# Altium footprint library power_board_pcbblib.PcbLib: 57 footprints (part 2 of 4)
Each footprint in its own frame and in the unit in brackets; x right, y up, seen from the top. Pads: shape width x height; smd on the part's side, far side on the other; paste and mask are expansions set on the pad; w line width, h text height; cw(c..) or ccw(c..) is an arc to the next point about the centre after c.
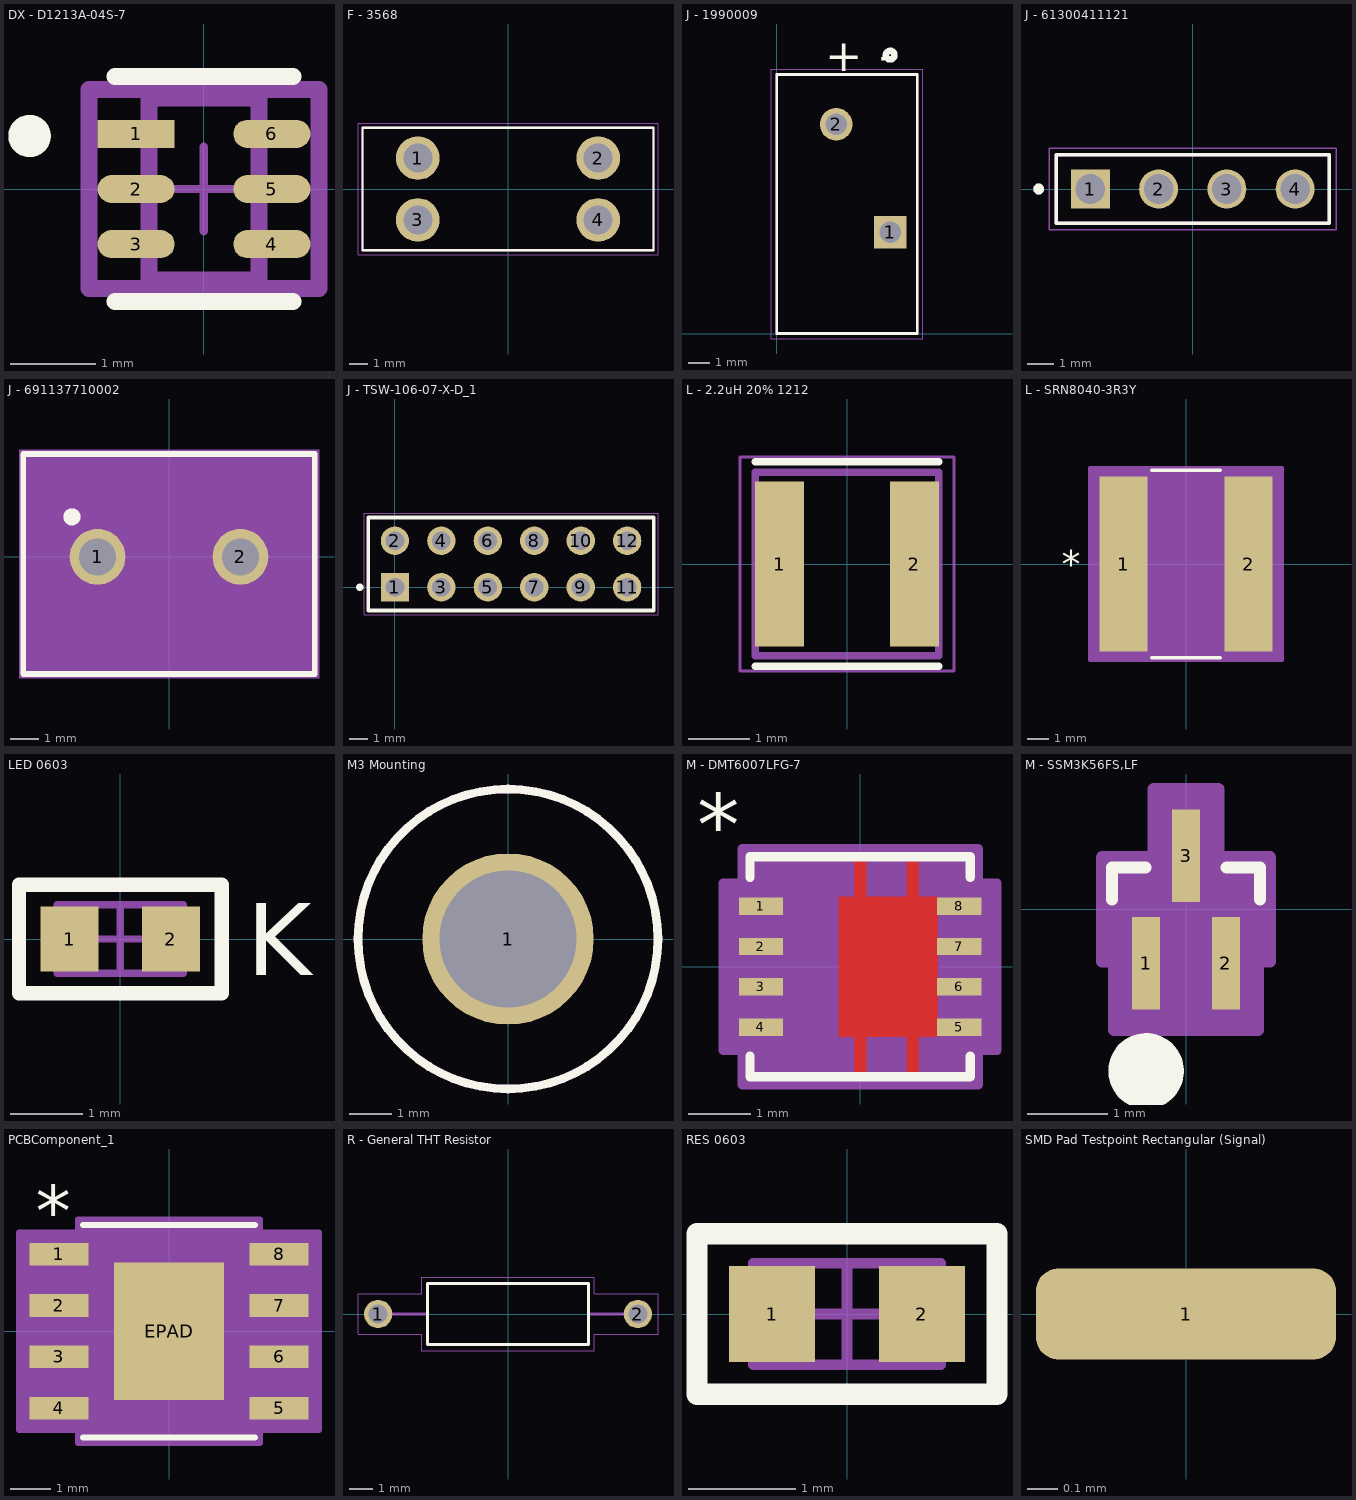
[diagram p1: the footprints below, top view; thin cyan lines are the x and y axes]

## DX - D1213A-04S-7 [mm]
pads (6):
  rect 0.91x0.332 smd paste+0 mask+0: 1(-0.801,0.65)
  rrect100% 0.91x0.332 smd paste+0 mask+0: 2(-0.801,0) 3(-0.801,-0.65) 4(0.801,-0.65) 5(0.801,0) 6(0.801,0.65)
Top Overlay:
  circle w0.25: c-2.056,0.625 r0.125
  lines w0.2: -1.05,-1.325 1.05,-1.325 ; -1.05,1.325 1.05,1.325
Top 3D Body:
  lines w0.2: -0.65,-1.075 -0.65,1.075 0.65,1.075 0.65,-1.075 -0.65,-1.075
Board:
  lines w0.2: -1.356,-1.175 -1.356,1.175 1.356,1.175 1.356,-1.175 -1.356,-1.175
Top Assembly:
  lines w0.2: -1.356,-1.175 -1.356,1.175 1.356,1.175 1.356,-1.175 -1.356,-1.175
  text ".Designator" at 0,0.188 h1
Top Component Center:
  lines w0.1: -0.5,0 0.5,0 ; 0,-0.5 0,0.5
3D body "Trans_Diodes_BSS8402DW-7-F_eec.STEP": height 0.25, standoff 0, extent -1.356,-1.175 1.356,1.175

## F - 3568 [mm] "3568 - Fuse Holder 30 A 500V 1 Circuit Blade Through Hole"
pads (4):
  round 2.4 hole 1.6: 1(-4.96,1.7) 2(4.96,1.7) 3(-4.96,-1.7) 4(4.96,-1.7)
Top Overlay:
  lines w0.127: -8,-3.365 -8,3.365 8,3.365 8,-3.365 -8,-3.365
Mechanical 13:
  lines w0.127: -8,-3.365 -8,3.365 8,3.365 8,-3.365 -8,-3.365
Mechanical 15:
  lines w0.05: -8.25,-3.615 -8.25,3.615 8.25,3.615 8.25,-3.615 -8.25,-3.615
3D body "step_temp.STEP": height 7.38, standoff -2.78, extent -8,-3.366 8.002,3.365

## J - 1990009 [mm]
pads (2):
  rect 1.508x1.508 / inner round 1.508 / far side rect 1.508x1.508 hole 1: 1(5.25,4.7)
  round 1.508 hole 1: 2(2.75,9.7)
Top Overlay:
  circle w0.3: c5.25,12.9 r0.2
  lines w0.127: 0,0 6.5,0 6.5,12 0,12 0,0
  text "+" at 2.25,12.15 h1.5
  text "-" at 4.75,12.15 h1.5
Mechanical 13:
  lines w0.127: 0,0 6.5,0 6.5,12 0,12 0,0
Mechanical 15:
  lines w0.05: -0.25,-0.25 6.75,-0.25 6.75,12.25 -0.25,12.25 -0.25,-0.25
3D body "1990009--3DModel-STEP-269445.STEP": height 13.11, standoff -3.49, extent -0.05,-0.014 6.45,11.986

## J - 61300411121 [mm]
pads (4):
  rect 1.45x1.45 / inner round 1.45 / far side rect 1.45x1.45 hole 1.1: 1(-3.81,0)
  round 1.45 hole 1.1: 2(-1.27,0) 3(1.27,0) 4(3.81,0)
Top Overlay:
  circle w0.2: c-5.73,0 r0.1
  lines w0.127: -5.08,-1.27 5.08,-1.27 5.08,1.27 -5.08,1.27 -5.08,-1.27
Mechanical 13:
  circle w0.2: c-5.73,0 r0.1
  lines w0.127: -5.08,-1.27 5.08,-1.27 5.08,1.27 -5.08,1.27 -5.08,-1.27
Mechanical 15:
  lines w0.05: -5.33,-1.52 5.33,-1.52 5.33,1.52 -5.33,1.52 -5.33,-1.52
3D body "step_temp.STEP": height 7.27, standoff -4.27, extent -5.08,-1.27 5.08,1.27

## J - 691137710002 [mm]
pads (2):
  round 1.95 hole 1.3: 1(-2.5,0) 2(2.5,0)
Top Overlay:
  circle w0.4: c-3.4,1.4 r0.1
  lines w0.2: -5.1,-4.1 5.1,-4.1 5.1,3.6 -5.1,3.6 -5.1,-4.1
Mechanical 13:
  lines w0.1: -5,-4 5,-4 5,3.5 -5,3.5 -5,-4
Mechanical 15:
  region: 5.25,-4.25 -5.25,-4.25 -5.25,3.75 5.25,3.75
3D body "step_temp.STEP": height 11.5, standoff -3.6, extent -5,-3.9 5,3.6

## J - TSW-106-07-X-D_1 [mm]
pads (12):
  rect 1.55x1.55 hole 1.02: 1(0,0)
  round 1.55 hole 1.02: 2(0,2.54) 3(2.54,0) 4(2.54,2.54) 5(5.08,0) 6(5.08,2.54) 7(7.62,0) 8(7.62,2.54) 9(10.16,0) 10(10.16,2.54) 11(12.7,0) 12(12.7,2.54)
Top Overlay:
  circle w0.2: c-1.92,0 r0.1
  lines w0.2: -1.46,-1.27 -1.46,3.81 14.16,3.81 14.16,-1.27 -1.46,-1.27
Mechanical 13:
  lines w0.1: -1.46,-1.27 -1.46,3.81 14.16,3.81 14.16,-1.27 -1.46,-1.27
Mechanical 15:
  lines w0.05: -1.685,-1.495 -1.685,4.035 14.385,4.035 14.385,-1.495 -1.685,-1.495
3D body "TSW-106-07-X-D.step": height 8.38, standoff -2.54, extent -1.27,-1.27 13.97,3.81

## L - 2.2uH 20% 1212 [mm]
pads (2):
  rect 0.8x2.7 smd: 1(-1.1,0) 2(1.1,0)
Top Overlay:
  lines w0.127: -1.5,-1.67 1.5,-1.67 ; -1.5,1.67 1.5,1.67
Mechanical 13:
  lines w0.127: -1.5,-1.5 1.5,-1.5 1.5,1.5 -1.5,1.5 -1.5,-1.5
Mechanical 15:
  lines w0.05: -1.75,-1.75 1.75,-1.75 1.75,1.75 -1.75,1.75 -1.75,-1.75
3D body "LQH3NPZ2R2MMEL.STEP": height 1.51, standoff 0.01, extent -1.5,-1.5 1.5,1.5

## L - SRN8040-3R3Y [mil] "SRN8040-3R3Y"
pads (2):
  rect 87x315 smd paste+0 mask+0: 1(-112.5,0) 2(112.5,0)
Top Overlay:
  lines w6: -61.89,-168.5 61.89,-168.5 ; -61.89,168.5 61.89,168.5
  text "*" at -223.35,-24.99 h50
Mechanical 13:
  lines w1: -163.5,-81.75 -163.5,81.75 -81.75,163.5 81.75,163.5 163.5,81.75 163.5,-81.75 81.75,-163.5 -81.75,-163.5 -163.5,-81.75
  text "*" at -156,-50 h50
Mechanical 15:
  region: 173.5,-173.5 -173.5,-173.5 -173.5,173.5 173.5,173.5
  lines w6: -173.5,-173.5 -173.5,173.5 173.5,173.5 173.5,-173.5 -173.5,-173.5
3D body "7435157.stp": height 157.98, standoff 0.5, extent -157.48,-157.48 157.48,157.48

## LED 0603 [mm]
pads (2):
  rect 0.8x0.9 smd: 1(-0.7,0) 2(0.7,0)
Top Overlay:
  lines w0.2: -1.4,-0.75 -1.4,0.75 1.4,0.75 1.4,-0.75 -1.4,-0.75
  text "K" at 1.748,-0.5 h1
Mechanical 13:
  lines w0.1: -0.875,-0.475 -0.875,0.475 0.875,0.475 0.875,-0.475 -0.875,-0.475
Mechanical 15:
  lines w0.1: -0.475,0 0.475,0 ; 0,-0.475 0,0.475 ; -1.4,-0.75 1.4,-0.75 1.4,0.75 -1.4,0.75 -1.4,-0.75
3D body "Diode_Osram_Opto_LS_L29K-G1J2-1-Z_eec.STEP": height 0.25, standoff 0, extent -1.25,-0.55 1.25,0.55

## M3 Mounting [mm]
pads (1):
  round 4 hole 3.2: 1(0,0)
Top Layer keep-out:
  circle w0.2: c0,0 r3.5
Top Overlay:
  circle w0.2: c0,0 r3.5

## M - DMT6007LFG-7 [mil]
height 267.72
pads (8):
  rect 28x11 smd paste+0 mask+0: 1(-63,38.39) 2(-63,12.8) 3(-63,-12.8) 4(-63,-38.39) 5(63,-38.39) 6(63,-12.8) 7(63,12.8) 8(63,38.39)
Top Layer:
  rectangle: -3.94,-66.93 3.94,-43.31
  rectangle: 29.53,-66.93 37.4,-43.31
  rectangle: -3.94,43.31 3.94,66.93
  rectangle: 29.53,43.31 37.4,66.93
  region: -13.7,44.5 49.3,44.5 49.3,-44.5 -13.7,-44.5
Top Overlay:
  lines w6: -70,-56.99 -70,-70 70,-70 70,-56.99 ; -70,56.99 -70,70 70,70 70,56.99
  text "*" at -103.67,70.87 h39.37
Top Paste:
  region: -13.7,44.5 49.3,44.5 49.3,-44.5 -13.7,-44.5
Top Solder:
  rectangle: -3.94,-66.93 3.94,-43.31
  rectangle: 29.53,-66.93 37.4,-43.31
  rectangle: -3.94,43.31 3.94,66.93
  rectangle: 29.53,43.31 37.4,66.93
  region: -13.7,44.5 49.3,44.5 49.3,-44.5 -13.7,-44.5
Mechanical 13:
  lines w1: -12,65 ccw(c0,65) 12,65 ; -65,-65 -65,65 65,65 65,-65 -65,-65
Mechanical 15:
  region: -75,-53.18 -87,-53.18 -87,53.18 -75,53.18 -75,75 75,75 75,53.18 87,53.18 87,-53.18 75,-53.18 75,-75 -75,-75
  lines w6: -87,-53.18 -75,-53.18 -75,-75 75,-75 75,-53.18 87,-53.18 87,53.18 75,53.18 75,75 -75,75 -75,53.18 -87,53.18 -87,-53.18
3D body "DMT6007LFG-7.step": height 35.94, standoff 0.5, extent -64.96,-64.96 64.96,64.96

## M - SSM3K56FS,LF [mm]
pads (3):
  rect 0.351x1.161 smd paste+0 mask+0: 1(-0.5,-0.675) 2(0.5,-0.675) 3(0,0.675)
Top Overlay:
  circle w0.5: c-0.5,-2.025 r0.225
  lines w0.152: -0.927,0.123 -0.927,0.527 -0.508,0.527 ; 0.508,0.527 0.927,0.527 0.927,0.123
Mechanical 13:
  lines w0.025: -0.8,-0.4 -0.8,0.4 0.8,0.4 0.8,-0.4 -0.8,-0.4 ; -0.65,-0.9 -0.35,-0.9 -0.35,-0.4 -0.65,-0.4 -0.65,-0.9 ; -0.15,0.4 -0.15,0.9 0.15,0.9 0.15,0.4 -0.15,0.4 ; 0.35,-0.9 0.65,-0.9 0.65,-0.4 0.35,-0.4 0.35,-0.9
Mechanical 15:
  region: -1.054,-0.654 -1.054,0.654 -0.404,0.654 -0.404,1.51 0.404,1.51 0.404,0.654 1.054,0.654 1.054,-0.654 0.904,-0.654 0.904,-1.51 -0.904,-1.51 -0.904,-0.654
  lines w0.152: -1.054,-0.654 -0.904,-0.654 -0.904,-1.51 0.904,-1.51 0.904,-0.654 1.054,-0.654 1.054,0.654 0.404,0.654 0.404,1.51 -0.404,1.51 -0.404,0.654 -1.054,0.654 -1.054,-0.654
3D body "SSM_TOS.step": height 0.8, standoff 0, extent -0.8,-0.9 0.8,0.9

## PCBComponent_1 [mil]
pads (9):
  rect 57.5x22 smd paste+0 mask+0: 1(-107.25,75) 2(-107.25,25) 3(-107.25,-25) 4(-107.25,-75) 5(107.25,-75) 6(107.25,-25) 7(107.25,25) 8(107.25,75)
  rect 107x134 smd paste-66.5 mask+0: EPAD(0,0)
Top Overlay:
  lines w6: -83.5,-103.5 83.5,-103.5 ; -83.5,103.5 83.5,103.5
  text "*" at -129.75,92 h50
Top Paste:
  region: -3.94,63.06 -49.56,63.06 -49.56,3.94 -3.94,3.94
  region: -3.94,-3.94 -49.56,-3.94 -49.56,-63.06 -3.94,-63.06
  region: 49.56,63.06 3.94,63.06 3.94,3.94 49.56,3.94
  region: 49.56,-3.94 3.94,-3.94 3.94,-63.06 49.56,-63.06
Mechanical 13:
  lines w1: -12,98.5 ccw(c0,98.5) 12,98.5 ; -122,-85 -122,-65 -78.5,-65 -78.5,-85 -122,-85 ; -122,-35 -122,-15 -78.5,-15 -78.5,-35 -122,-35 ; -122,15 -122,35 -78.5,35 -78.5,15 -122,15 ; -122,65 -122,85 -78.5,85 -78.5,65 -122,65 ; -78.5,-98.5 78.5,-98.5 78.5,98.5 -78.5,98.5 -78.5,-98.5 ; 78.5,-85 78.5,-65 122,-65 122,-85 78.5,-85 ; 78.5,-35 78.5,-15 122,-15 122,-35 78.5,-35 ; 78.5,15 78.5,35 122,35 122,15 78.5,15 ; 78.5,65 78.5,85 122,85 122,65 78.5,65
  text "*" at -76,45.5 h50
Mechanical 15:
  region: -88.5,-96 -146,-96 -146,96 -88.5,96 -88.5,108.5 88.5,108.5 88.5,96 146,96 146,-96 88.5,-96 88.5,-108.5 -88.5,-108.5
  lines w6: -146,-96 -146,96 -88.5,96 -88.5,108.5 88.5,108.5 88.5,96 146,96 146,-96 88.5,-96 88.5,-108.5 -88.5,-108.5 -88.5,-96 -146,-96
3D body "SOIC8_DDA_TEX.step": height 67.09, standoff 0, extent -122.01,-98.5 122.01,98.5

## R - General THT Resistor [mm] "10mm long in total and 7mm length in body and ~2mm wide."
pads (2):
  round 1.2 hole 0.8: 1(-5.5,0) 2(5.5,0)
Top Overlay:
  lines w0.127: -3.4,-1.3 -3.4,0 -3.4,1.3 3.4,1.3 3.4,0 3.4,-1.3 -3.4,-1.3
Mechanical 13:
  lines w0.127: -4.9,0 -3.4,0 ; 4.9,0 3.4,0 ; -3.4,0 -3.4,1.3 3.4,1.3 3.4,0 ; -3.4,0 -3.4,-1.3 3.4,-1.3 3.4,0
Mechanical 15:
  lines w0.05: -6.35,-0.85 -3.65,-0.85 -3.65,-1.55 3.65,-1.55 3.65,-0.85 6.35,-0.85 6.35,0.85 3.65,0.85 3.65,1.55 -3.65,1.55 -3.65,0.85 -6.35,0.85 -6.35,-0.85
3D body "step_temp.STEP": height 2.4, standoff -26.95, extent -5.775,-1.2 5.775,1.2

## RES 0603 [mm]
pads (2):
  rect 0.8x0.9 smd: 1(-0.7,0) 2(0.7,0)
Top Overlay:
  lines w0.2: -1.4,-0.75 -1.4,0.75 1.4,0.75 1.4,-0.75 -1.4,-0.75
Mechanical 13:
  lines w0.1: -0.875,-0.475 -0.875,0.475 0.875,0.475 0.875,-0.475 -0.875,-0.475
Mechanical 15:
  lines w0.1: -0.475,0 0.475,0 ; 0,-0.475 0,0.475 ; -1.4,-0.75 1.4,-0.75 1.4,0.75 -1.4,0.75 -1.4,-0.75
3D body: height 1.3, standoff 0, extent -0.875,-0.475 0.875,0.475

## SMD Pad Testpoint Rectangular (Signal) [mm]
pads (1):
  rrect50% 1x0.305 smd paste-2539.97 mask+0.051: 1(0,0)